# Altium schematic symbol library jlcpcb_2025_04_capacitors_extended_0805.schlib: 3281 symbols (part 8 of 18) (continued)
## CC0805JRNPO9BN121
designator C?  Capacitance: 120pF  (hidden comment: *)
Capacitor, Ceramic (MLCC), 120pF, ±5%, 50V, NP0, ±5%, SMD 0805; Manufacturer: YAGEO; Manufacturer Part Number: CC0805JRNPO9BN121; Package Size: 0805; JLCPCB Basic Part: No; JLCPCB Part Number: C107109; Supplier 1: LCSC; Category: Capacitors - MLCC; Supplier Part Number 1: C107109; Tolerance: ±5%; Voltage Rating: 50V; Temperature Coefficient: NP0; RoHS: Yes; ComponentLink1Description: Datasheet; ComponentLink1URL: https://wmsc.lcsc.com/wmsc/upload/file/pdf/v2/lcsc/2304140030_YAGEO-CC0805JRNPO9BN121_C107109.pdf; ComponentLink2Description: JLCPCB Part URL; ComponentLink2URL: https://jlcpcb.com/partdetail/C107109; ComponentLink3Description: LCSC Part URL; ComponentLink3URL: https://lcsc.com/product-detail/Multilayer-Ceramic-Capacitors-MLCC---SMD-SMT_YAGEO-YAGEO-CC0805JRNPO9BN121_C107109.html
footprint CAP-0805 (0805 (2012M) Capacitor)
pins: 1, 2

## CC0805JRNPO9BN122
designator C?  Capacitance: 1.2nF  (hidden comment: *)
Capacitor, Ceramic (MLCC), 1.2nF, ±5%, 50V, NP0, ±5%, SMD 0805; Manufacturer: YAGEO; Manufacturer Part Number: CC0805JRNPO9BN122; Package Size: 0805; JLCPCB Basic Part: No; JLCPCB Part Number: C113824; Supplier 1: LCSC; Category: Capacitors - MLCC; Supplier Part Number 1: C113824; Tolerance: ±5%; Voltage Rating: 50V; Temperature Coefficient: NP0; RoHS: Yes; ComponentLink1Description: Datasheet; ComponentLink1URL: https://wmsc.lcsc.com/wmsc/upload/file/pdf/v2/lcsc/2304140030_YAGEO-CC0805JRNPO9BN122_C113824.pdf; ComponentLink2Description: JLCPCB Part URL; ComponentLink2URL: https://jlcpcb.com/partdetail/C113824; ComponentLink3Description: LCSC Part URL; ComponentLink3URL: https://lcsc.com/product-detail/Multilayer-Ceramic-Capacitors-MLCC---SMD-SMT_YAGEO-YAGEO-CC0805JRNPO9BN122_C113824.html
footprint CAP-0805 (0805 (2012M) Capacitor)
pins: 1, 2

## CC0805JRNPO9BN130
designator C?  Capacitance: 13pF  (hidden comment: *)
Capacitor, Ceramic (MLCC), 13pF, ±5%, 50V, NP0, ±5%, SMD 0805; Manufacturer: YAGEO; Manufacturer Part Number: CC0805JRNPO9BN130; Package Size: 0805; JLCPCB Basic Part: No; JLCPCB Part Number: C519918; Supplier 1: LCSC; Category: Capacitors - MLCC; Supplier Part Number 1: C519918; Tolerance: ±5%; Voltage Rating: 50V; Temperature Coefficient: NP0; RoHS: Yes; ComponentLink1Description: Datasheet; ComponentLink1URL: https://wmsc.lcsc.com/wmsc/upload/file/pdf/v2/lcsc/2008031233_YAGEO-CC0805JRNPO9BN130_C519918.pdf; ComponentLink2Description: JLCPCB Part URL; ComponentLink2URL: https://jlcpcb.com/partdetail/C519918; ComponentLink3Description: LCSC Part URL; ComponentLink3URL: https://lcsc.com/product-detail/Multilayer-Ceramic-Capacitors-MLCC---SMD-SMT_YAGEO-YAGEO-CC0805JRNPO9BN130_C519918.html
footprint CAP-0805 (0805 (2012M) Capacitor)
pins: 1, 2

## CC0805JRNPO9BN131
designator C?  Capacitance: 130pF  (hidden comment: *)
Capacitor, Ceramic (MLCC), 130pF, ±5%, 50V, NP0, ±5%, SMD 0805; Manufacturer: YAGEO; Manufacturer Part Number: CC0805JRNPO9BN131; Package Size: 0805; JLCPCB Basic Part: No; JLCPCB Part Number: C520003; Supplier 1: LCSC; Category: Capacitors - MLCC; Supplier Part Number 1: C520003; Tolerance: ±5%; Voltage Rating: 50V; Temperature Coefficient: NP0; RoHS: Yes; ComponentLink1Description: Datasheet; ComponentLink1URL: https://wmsc.lcsc.com/wmsc/upload/file/pdf/v2/lcsc/2006011836_YAGEO-CC0805JRNPO9BN131_C520003.pdf; ComponentLink2Description: JLCPCB Part URL; ComponentLink2URL: https://jlcpcb.com/partdetail/C520003; ComponentLink3Description: LCSC Part URL; ComponentLink3URL: https://lcsc.com/product-detail/Multilayer-Ceramic-Capacitors-MLCC---SMD-SMT_YAGEO-YAGEO-CC0805JRNPO9BN131_C520003.html
footprint CAP-0805 (0805 (2012M) Capacitor)
pins: 1, 2

## CC0805JRNPO9BN140
designator C?  Capacitance: 14pF  (hidden comment: *)
Capacitor, Ceramic (MLCC), 14pF, ±5%, 50V, NP0, ±5%, SMD 0805; Manufacturer: YAGEO; Manufacturer Part Number: CC0805JRNPO9BN140; Package Size: 0805; JLCPCB Basic Part: No; JLCPCB Part Number: C519919; Supplier 1: LCSC; Category: Capacitors - MLCC; Supplier Part Number 1: C519919; Tolerance: ±5%; Voltage Rating: 50V; Temperature Coefficient: NP0; RoHS: Yes; ComponentLink1Description: Datasheet; ComponentLink1URL: https://wmsc.lcsc.com/wmsc/upload/file/pdf/v2/lcsc/2010251434_YAGEO-CC0805JRNPO9BN140_C519919.pdf; ComponentLink2Description: JLCPCB Part URL; ComponentLink2URL: https://jlcpcb.com/partdetail/C519919; ComponentLink3Description: LCSC Part URL; ComponentLink3URL: https://lcsc.com/product-detail/Multilayer-Ceramic-Capacitors-MLCC---SMD-SMT_YAGEO-YAGEO-CC0805JRNPO9BN140_C519919.html
footprint CAP-0805 (0805 (2012M) Capacitor)
pins: 1, 2

## CC0805JRNPO9BN150
designator C?  Capacitance: 15pF  (hidden comment: *)
Capacitor, Ceramic (MLCC), 15pF, ±5%, 50V, NP0, ±5%, SMD 0805; Manufacturer: YAGEO; Manufacturer Part Number: CC0805JRNPO9BN150; Package Size: 0805; JLCPCB Basic Part: No; JLCPCB Part Number: C107110; Supplier 1: LCSC; Category: Capacitors - MLCC; Supplier Part Number 1: C107110; Tolerance: ±5%; Voltage Rating: 50V; Temperature Coefficient: NP0; RoHS: Yes; ComponentLink1Description: Datasheet; ComponentLink1URL: https://wmsc.lcsc.com/wmsc/upload/file/pdf/v2/lcsc/2304140030_YAGEO-CC0805JRNPO9BN150_C107110.pdf; ComponentLink2Description: JLCPCB Part URL; ComponentLink2URL: https://jlcpcb.com/partdetail/C107110; ComponentLink3Description: LCSC Part URL; ComponentLink3URL: https://lcsc.com/product-detail/Multilayer-Ceramic-Capacitors-MLCC---SMD-SMT_YAGEO-YAGEO-CC0805JRNPO9BN150_C107110.html
footprint CAP-0805 (0805 (2012M) Capacitor)
pins: 1, 2

## CC0805JRNPO9BN151
designator C?  Capacitance: 150pF  (hidden comment: *)
Capacitor, Ceramic (MLCC), 150pF, ±5%, 50V, NP0, ±5%, SMD 0805; Manufacturer: YAGEO; Manufacturer Part Number: CC0805JRNPO9BN151; Package Size: 0805; JLCPCB Basic Part: No; JLCPCB Part Number: C107111; Supplier 1: LCSC; Category: Capacitors - MLCC; Supplier Part Number 1: C107111; Tolerance: ±5%; Voltage Rating: 50V; Temperature Coefficient: NP0; RoHS: Yes; ComponentLink1Description: Datasheet; ComponentLink1URL: https://wmsc.lcsc.com/wmsc/upload/file/pdf/v2/lcsc/2304140030_YAGEO-CC0805JRNPO9BN151_C107111.pdf; ComponentLink2Description: JLCPCB Part URL; ComponentLink2URL: https://jlcpcb.com/partdetail/C107111; ComponentLink3Description: LCSC Part URL; ComponentLink3URL: https://lcsc.com/product-detail/Multilayer-Ceramic-Capacitors-MLCC---SMD-SMT_YAGEO-YAGEO-CC0805JRNPO9BN151_C107111.html
footprint CAP-0805 (0805 (2012M) Capacitor)
pins: 1, 2

## CC0805JRNPO9BN152
designator C?  Capacitance: 1.5nF  (hidden comment: *)
Capacitor, Ceramic (MLCC), 1.5nF, ±5%, 50V, NP0, ±5%, SMD 0805; Manufacturer: YAGEO; Manufacturer Part Number: CC0805JRNPO9BN152; Package Size: 0805; JLCPCB Basic Part: No; JLCPCB Part Number: C123260; Supplier 1: LCSC; Category: Capacitors - MLCC; Supplier Part Number 1: C123260; Tolerance: ±5%; Voltage Rating: 50V; Temperature Coefficient: NP0; RoHS: Yes; ComponentLink1Description: Datasheet; ComponentLink1URL: https://wmsc.lcsc.com/wmsc/upload/file/pdf/v2/lcsc/2311211121_YAGEO-CC0805JRNPO9BN152_C123260.pdf; ComponentLink2Description: JLCPCB Part URL; ComponentLink2URL: https://jlcpcb.com/partdetail/C123260; ComponentLink3Description: LCSC Part URL; ComponentLink3URL: https://lcsc.com/product-detail/Multilayer-Ceramic-Capacitors-MLCC---SMD-SMT_YAGEO-YAGEO-CC0805JRNPO9BN152_C123260.html
footprint CAP-0805 (0805 (2012M) Capacitor)
pins: 1, 2

## CC0805JRNPO9BN160
designator C?  Capacitance: 16pF  (hidden comment: *)
Capacitor, Ceramic (MLCC), 16pF, ±5%, 50V, NP0, ±5%, SMD 0805; Manufacturer: YAGEO; Manufacturer Part Number: CC0805JRNPO9BN160; Package Size: 0805; JLCPCB Basic Part: No; JLCPCB Part Number: C519920; Supplier 1: LCSC; Category: Capacitors - MLCC; Supplier Part Number 1: C519920; Tolerance: ±5%; Voltage Rating: 50V; Temperature Coefficient: NP0; RoHS: Yes; ComponentLink1Description: Datasheet; ComponentLink1URL: https://wmsc.lcsc.com/wmsc/upload/file/pdf/v2/lcsc/2008031233_YAGEO-CC0805JRNPO9BN160_C519920.pdf; ComponentLink2Description: JLCPCB Part URL; ComponentLink2URL: https://jlcpcb.com/partdetail/C519920; ComponentLink3Description: LCSC Part URL; ComponentLink3URL: https://lcsc.com/product-detail/Multilayer-Ceramic-Capacitors-MLCC---SMD-SMT_YAGEO-YAGEO-CC0805JRNPO9BN160_C519920.html
footprint CAP-0805 (0805 (2012M) Capacitor)
pins: 1, 2

## CC0805JRNPO9BN161
designator C?  Capacitance: 160pF  (hidden comment: *)
Capacitor, Ceramic (MLCC), 160pF, ±5%, 50V, NP0, ±5%, SMD 0805; Manufacturer: YAGEO; Manufacturer Part Number: CC0805JRNPO9BN161; Package Size: 0805; JLCPCB Basic Part: No; JLCPCB Part Number: C1853295; Supplier 1: LCSC; Category: Capacitors - MLCC; Supplier Part Number 1: C1853295; Tolerance: ±5%; Voltage Rating: 50V; Temperature Coefficient: NP0; RoHS: Yes; ComponentLink1Description: Datasheet; ComponentLink1URL: https://wmsc.lcsc.com/wmsc/upload/file/pdf/v2/lcsc/2201271030_YAGEO-CC0805JRNPO9BN161_C1853295.pdf; ComponentLink2Description: JLCPCB Part URL; ComponentLink2URL: https://jlcpcb.com/partdetail/C1853295; ComponentLink3Description: LCSC Part URL; ComponentLink3URL: https://lcsc.com/product-detail/Multilayer-Ceramic-Capacitors-MLCC---SMD-SMT_YAGEO-YAGEO-CC0805JRNPO9BN161_C1853295.html
footprint CAP-0805 (0805 (2012M) Capacitor)
pins: 1, 2

## CC0805JRNPO9BN180
designator C?  Capacitance: 18pF  (hidden comment: *)
Capacitor, Ceramic (MLCC), 18pF, ±5%, 50V, NP0, ±5%, SMD 0805; Manufacturer: YAGEO; Manufacturer Part Number: CC0805JRNPO9BN180; Package Size: 0805; JLCPCB Basic Part: No; JLCPCB Part Number: C113825; Supplier 1: LCSC; Category: Capacitors - MLCC; Supplier Part Number 1: C113825; Tolerance: ±5%; Voltage Rating: 50V; Temperature Coefficient: NP0; RoHS: Yes; ComponentLink1Description: Datasheet; ComponentLink1URL: https://wmsc.lcsc.com/wmsc/upload/file/pdf/v2/lcsc/2304140030_YAGEO-CC0805JRNPO9BN180_C113825.pdf; ComponentLink2Description: JLCPCB Part URL; ComponentLink2URL: https://jlcpcb.com/partdetail/C113825; ComponentLink3Description: LCSC Part URL; ComponentLink3URL: https://lcsc.com/product-detail/Multilayer-Ceramic-Capacitors-MLCC---SMD-SMT_YAGEO-YAGEO-CC0805JRNPO9BN180_C113825.html
footprint CAP-0805 (0805 (2012M) Capacitor)
pins: 1, 2

## CC0805JRNPO9BN181
designator C?  Capacitance: 180pF  (hidden comment: *)
Capacitor, Ceramic (MLCC), 180pF, ±5%, 50V, NP0, ±5%, SMD 0805; Manufacturer: YAGEO; Manufacturer Part Number: CC0805JRNPO9BN181; Package Size: 0805; JLCPCB Basic Part: No; JLCPCB Part Number: C113826; Supplier 1: LCSC; Category: Capacitors - MLCC; Supplier Part Number 1: C113826; Tolerance: ±5%; Voltage Rating: 50V; Temperature Coefficient: NP0; RoHS: Yes; ComponentLink1Description: Datasheet; ComponentLink1URL: https://wmsc.lcsc.com/wmsc/upload/file/pdf/v2/lcsc/2304140030_YAGEO-CC0805JRNPO9BN181_C113826.pdf; ComponentLink2Description: JLCPCB Part URL; ComponentLink2URL: https://jlcpcb.com/partdetail/C113826; ComponentLink3Description: LCSC Part URL; ComponentLink3URL: https://lcsc.com/product-detail/Multilayer-Ceramic-Capacitors-MLCC---SMD-SMT_YAGEO-YAGEO-CC0805JRNPO9BN181_C113826.html
footprint CAP-0805 (0805 (2012M) Capacitor)
pins: 1, 2

## CC0805JRNPO9BN182
designator C?  Capacitance: 1.8nF  (hidden comment: *)
Capacitor, Ceramic (MLCC), 1.8nF, ±5%, 50V, NP0, ±5%, SMD 0805; Manufacturer: YAGEO; Manufacturer Part Number: CC0805JRNPO9BN182; Package Size: 0805; JLCPCB Basic Part: No; JLCPCB Part Number: C541499; Supplier 1: LCSC; Category: Capacitors - MLCC; Supplier Part Number 1: C541499; Tolerance: ±5%; Voltage Rating: 50V; Temperature Coefficient: NP0; RoHS: Yes; ComponentLink1Description: Datasheet; ComponentLink1URL: https://wmsc.lcsc.com/wmsc/upload/file/pdf/v2/lcsc/2006151141_YAGEO-CC0805JRNPO9BN182_C541499.pdf; ComponentLink2Description: JLCPCB Part URL; ComponentLink2URL: https://jlcpcb.com/partdetail/C541499; ComponentLink3Description: LCSC Part URL; ComponentLink3URL: https://lcsc.com/product-detail/Multilayer-Ceramic-Capacitors-MLCC---SMD-SMT_YAGEO-YAGEO-CC0805JRNPO9BN182_C541499.html
footprint CAP-0805 (0805 (2012M) Capacitor)
pins: 1, 2

## CC0805JRNPO9BN200
designator C?  Capacitance: 20pF  (hidden comment: *)
Capacitor, Ceramic (MLCC), 20pF, ±5%, 50V, NP0, ±5%, SMD 0805; Manufacturer: YAGEO; Manufacturer Part Number: CC0805JRNPO9BN200; Package Size: 0805; JLCPCB Basic Part: No; JLCPCB Part Number: C105173; Supplier 1: LCSC; Category: Capacitors - MLCC; Supplier Part Number 1: C105173; Tolerance: ±5%; Voltage Rating: 50V; Temperature Coefficient: NP0; RoHS: Yes; ComponentLink1Description: Datasheet; ComponentLink1URL: https://wmsc.lcsc.com/wmsc/upload/file/pdf/v2/lcsc/2304140030_YAGEO-CC0805JRNPO9BN200_C105173.pdf; ComponentLink2Description: JLCPCB Part URL; ComponentLink2URL: https://jlcpcb.com/partdetail/C105173; ComponentLink3Description: LCSC Part URL; ComponentLink3URL: https://lcsc.com/product-detail/Multilayer-Ceramic-Capacitors-MLCC---SMD-SMT_YAGEO-YAGEO-CC0805JRNPO9BN200_C105173.html
footprint CAP-0805 (0805 (2012M) Capacitor)
pins: 1, 2

## CC0805JRNPO9BN201
designator C?  Capacitance: 200pF  (hidden comment: *)
Capacitor, Ceramic (MLCC), 200pF, ±5%, 50V, NP0, ±5%, SMD 0805; Manufacturer: YAGEO; Manufacturer Part Number: CC0805JRNPO9BN201; Package Size: 0805; JLCPCB Basic Part: No; JLCPCB Part Number: C520004; Supplier 1: LCSC; Category: Capacitors - MLCC; Supplier Part Number 1: C520004; Tolerance: ±5%; Voltage Rating: 50V; Temperature Coefficient: NP0; RoHS: Yes; ComponentLink1Description: Datasheet; ComponentLink1URL: https://wmsc.lcsc.com/wmsc/upload/file/pdf/v2/lcsc/2007231534_YAGEO-CC0805JRNPO9BN201_C520004.pdf; ComponentLink2Description: JLCPCB Part URL; ComponentLink2URL: https://jlcpcb.com/partdetail/C520004; ComponentLink3Description: LCSC Part URL; ComponentLink3URL: https://lcsc.com/product-detail/Multilayer-Ceramic-Capacitors-MLCC---SMD-SMT_YAGEO-YAGEO-CC0805JRNPO9BN201_C520004.html
footprint CAP-0805 (0805 (2012M) Capacitor)
pins: 1, 2

## CC0805JRNPO9BN220
designator C?  Capacitance: 22pF  (hidden comment: *)
Capacitor, Ceramic (MLCC), 22pF, ±5%, 50V, NP0, ±5%, SMD 0805; Manufacturer: YAGEO; Manufacturer Part Number: CC0805JRNPO9BN220; Package Size: 0805; JLCPCB Basic Part: No; JLCPCB Part Number: C105623; Supplier 1: LCSC; Category: Capacitors - MLCC; Supplier Part Number 1: C105623; Tolerance: ±5%; Voltage Rating: 50V; Temperature Coefficient: NP0; RoHS: Yes; ComponentLink1Description: Datasheet; ComponentLink1URL: https://wmsc.lcsc.com/wmsc/upload/file/pdf/v2/lcsc/2304140030_YAGEO-CC0805JRNPO9BN220_C105623.pdf; ComponentLink2Description: JLCPCB Part URL; ComponentLink2URL: https://jlcpcb.com/partdetail/C105623; ComponentLink3Description: LCSC Part URL; ComponentLink3URL: https://lcsc.com/product-detail/Multilayer-Ceramic-Capacitors-MLCC---SMD-SMT_YAGEO-YAGEO-CC0805JRNPO9BN220_C105623.html
footprint CAP-0805 (0805 (2012M) Capacitor)
pins: 1, 2

## CC0805JRNPO9BN221
designator C?  Capacitance: 220pF  (hidden comment: *)
Capacitor, Ceramic (MLCC), 220pF, ±5%, 50V, NP0, ±5%, SMD 0805; Manufacturer: YAGEO; Manufacturer Part Number: CC0805JRNPO9BN221; Package Size: 0805; JLCPCB Basic Part: No; JLCPCB Part Number: C107112; Supplier 1: LCSC; Category: Capacitors - MLCC; Supplier Part Number 1: C107112; Tolerance: ±5%; Voltage Rating: 50V; Temperature Coefficient: NP0; RoHS: Yes; ComponentLink1Description: Datasheet; ComponentLink1URL: https://wmsc.lcsc.com/wmsc/upload/file/pdf/v2/lcsc/2304140030_YAGEO-CC0805JRNPO9BN221_C107112.pdf; ComponentLink2Description: JLCPCB Part URL; ComponentLink2URL: https://jlcpcb.com/partdetail/C107112; ComponentLink3Description: LCSC Part URL; ComponentLink3URL: https://lcsc.com/product-detail/Multilayer-Ceramic-Capacitors-MLCC---SMD-SMT_YAGEO-YAGEO-CC0805JRNPO9BN221_C107112.html
footprint CAP-0805 (0805 (2012M) Capacitor)
pins: 1, 2

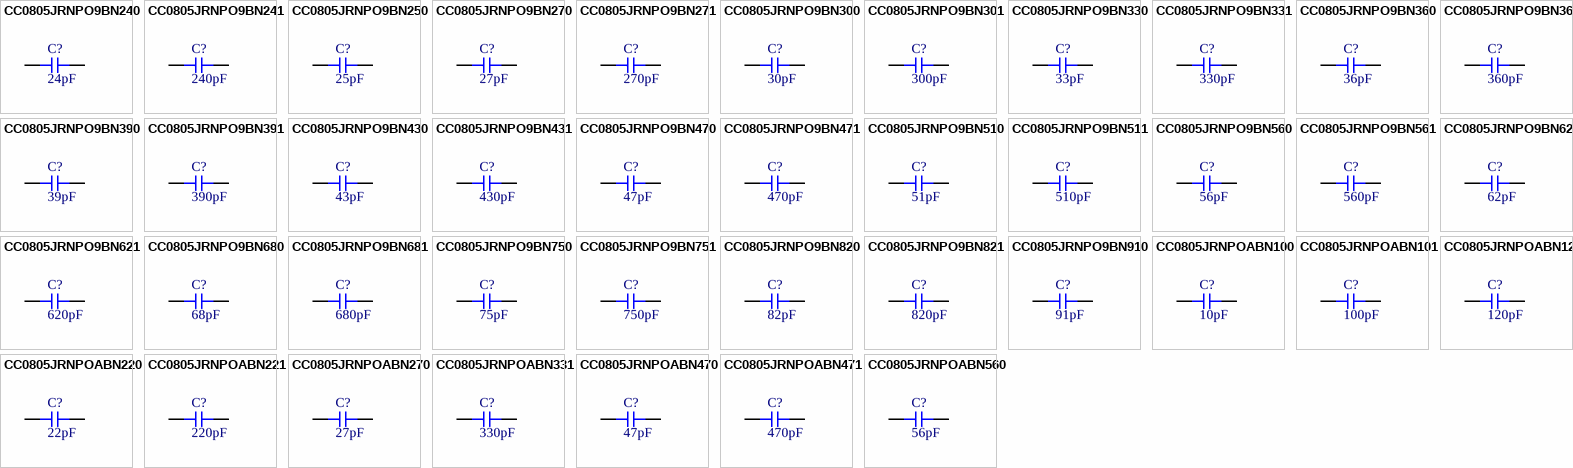
[diagram p36: symbols CC0805JRNPO9BN240 to CC0805JRNPOABN560]

## CC0805JRNPO9BN240
designator C?  Capacitance: 24pF  (hidden comment: *)
Capacitor, Ceramic (MLCC), 24pF, ±5%, 50V, NP0, ±5%, SMD 0805; Manufacturer: YAGEO; Manufacturer Part Number: CC0805JRNPO9BN240; Package Size: 0805; JLCPCB Basic Part: No; JLCPCB Part Number: C113827; Supplier 1: LCSC; Category: Capacitors - MLCC; Supplier Part Number 1: C113827; Tolerance: ±5%; Voltage Rating: 50V; Temperature Coefficient: NP0; RoHS: Yes; ComponentLink1Description: Datasheet; ComponentLink1URL: https://wmsc.lcsc.com/wmsc/upload/file/pdf/v2/lcsc/2304140030_YAGEO-CC0805JRNPO9BN240_C113827.pdf; ComponentLink2Description: JLCPCB Part URL; ComponentLink2URL: https://jlcpcb.com/partdetail/C113827; ComponentLink3Description: LCSC Part URL; ComponentLink3URL: https://lcsc.com/product-detail/Multilayer-Ceramic-Capacitors-MLCC---SMD-SMT_YAGEO-YAGEO-CC0805JRNPO9BN240_C113827.html
footprint CAP-0805 (0805 (2012M) Capacitor)
pins: 1, 2

## CC0805JRNPO9BN241
designator C?  Capacitance: 240pF  (hidden comment: *)
Capacitor, Ceramic (MLCC), 240pF, ±5%, 50V, NP0, ±5%, SMD 0805; Manufacturer: YAGEO; Manufacturer Part Number: CC0805JRNPO9BN241; Package Size: 0805; JLCPCB Basic Part: No; JLCPCB Part Number: C520005; Supplier 1: LCSC; Category: Capacitors - MLCC; Supplier Part Number 1: C520005; Tolerance: ±5%; Voltage Rating: 50V; Temperature Coefficient: NP0; RoHS: Yes; ComponentLink1Description: Datasheet; ComponentLink1URL: https://wmsc.lcsc.com/wmsc/upload/file/pdf/v2/lcsc/2007231534_YAGEO-CC0805JRNPO9BN241_C520005.pdf; ComponentLink2Description: JLCPCB Part URL; ComponentLink2URL: https://jlcpcb.com/partdetail/C520005; ComponentLink3Description: LCSC Part URL; ComponentLink3URL: https://lcsc.com/product-detail/Multilayer-Ceramic-Capacitors-MLCC---SMD-SMT_YAGEO-YAGEO-CC0805JRNPO9BN241_C520005.html
footprint CAP-0805 (0805 (2012M) Capacitor)
pins: 1, 2

## CC0805JRNPO9BN250
designator C?  Capacitance: 25pF  (hidden comment: *)
Capacitor, Ceramic (MLCC), 25pF, ±5%, 50V, NP0, ±5%, SMD 0805; Manufacturer: YAGEO; Manufacturer Part Number: CC0805JRNPO9BN250; Package Size: 0805; JLCPCB Basic Part: No; JLCPCB Part Number: C327030; Supplier 1: LCSC; Category: Capacitors - MLCC; Supplier Part Number 1: C327030; Tolerance: ±5%; Voltage Rating: 50V; Temperature Coefficient: NP0; RoHS: Yes; ComponentLink1Description: Datasheet; ComponentLink1URL: https://wmsc.lcsc.com/wmsc/upload/file/pdf/v2/lcsc/1811141227_YAGEO-CC0805JRNPO9BN250_C327030.pdf; ComponentLink2Description: JLCPCB Part URL; ComponentLink2URL: https://jlcpcb.com/partdetail/C327030; ComponentLink3Description: LCSC Part URL; ComponentLink3URL: https://lcsc.com/product-detail/Multilayer-Ceramic-Capacitors-MLCC---SMD-SMT_YAGEO-YAGEO-CC0805JRNPO9BN250_C327030.html
footprint CAP-0805 (0805 (2012M) Capacitor)
pins: 1, 2

## CC0805JRNPO9BN270
designator C?  Capacitance: 27pF  (hidden comment: *)
Capacitor, Ceramic (MLCC), 27pF, ±5%, 50V, NP0, ±5%, SMD 0805; Manufacturer: YAGEO; Manufacturer Part Number: CC0805JRNPO9BN270; Package Size: 0805; JLCPCB Basic Part: No; JLCPCB Part Number: C107113; Supplier 1: LCSC; Category: Capacitors - MLCC; Supplier Part Number 1: C107113; Tolerance: ±5%; Voltage Rating: 50V; Temperature Coefficient: NP0; RoHS: Yes; ComponentLink1Description: Datasheet; ComponentLink1URL: https://wmsc.lcsc.com/wmsc/upload/file/pdf/v2/lcsc/2304140030_YAGEO-CC0805JRNPO9BN270_C107113.pdf; ComponentLink2Description: JLCPCB Part URL; ComponentLink2URL: https://jlcpcb.com/partdetail/C107113; ComponentLink3Description: LCSC Part URL; ComponentLink3URL: https://lcsc.com/product-detail/Multilayer-Ceramic-Capacitors-MLCC---SMD-SMT_YAGEO-YAGEO-CC0805JRNPO9BN270_C107113.html
footprint CAP-0805 (0805 (2012M) Capacitor)
pins: 1, 2

## CC0805JRNPO9BN271
designator C?  Capacitance: 270pF  (hidden comment: *)
Capacitor, Ceramic (MLCC), 270pF, ±5%, 50V, NP0, ±5%, SMD 0805; Manufacturer: YAGEO; Manufacturer Part Number: CC0805JRNPO9BN271; Package Size: 0805; JLCPCB Basic Part: No; JLCPCB Part Number: C113828; Supplier 1: LCSC; Category: Capacitors - MLCC; Supplier Part Number 1: C113828; Tolerance: ±5%; Voltage Rating: 50V; Temperature Coefficient: NP0; RoHS: Yes; ComponentLink1Description: Datasheet; ComponentLink1URL: https://wmsc.lcsc.com/wmsc/upload/file/pdf/v2/lcsc/2304140030_YAGEO-CC0805JRNPO9BN271_C113828.pdf; ComponentLink2Description: JLCPCB Part URL; ComponentLink2URL: https://jlcpcb.com/partdetail/C113828; ComponentLink3Description: LCSC Part URL; ComponentLink3URL: https://lcsc.com/product-detail/Multilayer-Ceramic-Capacitors-MLCC---SMD-SMT_YAGEO-YAGEO-CC0805JRNPO9BN271_C113828.html
footprint CAP-0805 (0805 (2012M) Capacitor)
pins: 1, 2

## CC0805JRNPO9BN300
designator C?  Capacitance: 30pF  (hidden comment: *)
Capacitor, Ceramic (MLCC), 30pF, ±5%, 50V, NP0, ±5%, SMD 0805; Manufacturer: YAGEO; Manufacturer Part Number: CC0805JRNPO9BN300; Package Size: 0805; JLCPCB Basic Part: No; JLCPCB Part Number: C107114; Supplier 1: LCSC; Category: Capacitors - MLCC; Supplier Part Number 1: C107114; Tolerance: ±5%; Voltage Rating: 50V; Temperature Coefficient: NP0; RoHS: Yes; ComponentLink1Description: Datasheet; ComponentLink1URL: https://wmsc.lcsc.com/wmsc/upload/file/pdf/v2/lcsc/2304140030_YAGEO-CC0805JRNPO9BN300_C107114.pdf; ComponentLink2Description: JLCPCB Part URL; ComponentLink2URL: https://jlcpcb.com/partdetail/C107114; ComponentLink3Description: LCSC Part URL; ComponentLink3URL: https://lcsc.com/product-detail/Multilayer-Ceramic-Capacitors-MLCC---SMD-SMT_YAGEO-YAGEO-CC0805JRNPO9BN300_C107114.html
footprint CAP-0805 (0805 (2012M) Capacitor)
pins: 1, 2

## CC0805JRNPO9BN301
designator C?  Capacitance: 300pF  (hidden comment: *)
Capacitor, Ceramic (MLCC), 300pF, ±5%, 50V, NP0, ±5%, SMD 0805; Manufacturer: YAGEO; Manufacturer Part Number: CC0805JRNPO9BN301; Package Size: 0805; JLCPCB Basic Part: No; JLCPCB Part Number: C113829; Supplier 1: LCSC; Category: Capacitors - MLCC; Supplier Part Number 1: C113829; Tolerance: ±5%; Voltage Rating: 50V; Temperature Coefficient: NP0; RoHS: Yes; ComponentLink1Description: Datasheet; ComponentLink1URL: https://wmsc.lcsc.com/wmsc/upload/file/pdf/v2/lcsc/2304140030_YAGEO-CC0805JRNPO9BN301_C113829.pdf; ComponentLink2Description: JLCPCB Part URL; ComponentLink2URL: https://jlcpcb.com/partdetail/C113829; ComponentLink3Description: LCSC Part URL; ComponentLink3URL: https://lcsc.com/product-detail/Multilayer-Ceramic-Capacitors-MLCC---SMD-SMT_YAGEO-YAGEO-CC0805JRNPO9BN301_C113829.html
footprint CAP-0805 (0805 (2012M) Capacitor)
pins: 1, 2

## CC0805JRNPO9BN330
designator C?  Capacitance: 33pF  (hidden comment: *)
Capacitor, Ceramic (MLCC), 33pF, ±5%, 50V, NP0, ±5%, SMD 0805; Manufacturer: YAGEO; Manufacturer Part Number: CC0805JRNPO9BN330; Package Size: 0805; JLCPCB Basic Part: No; JLCPCB Part Number: C107115; Supplier 1: LCSC; Category: Capacitors - MLCC; Supplier Part Number 1: C107115; Tolerance: ±5%; Voltage Rating: 50V; Temperature Coefficient: NP0; RoHS: Yes; ComponentLink1Description: Datasheet; ComponentLink1URL: https://wmsc.lcsc.com/wmsc/upload/file/pdf/v2/lcsc/2304140030_YAGEO-CC0805JRNPO9BN330_C107115.pdf; ComponentLink2Description: JLCPCB Part URL; ComponentLink2URL: https://jlcpcb.com/partdetail/C107115; ComponentLink3Description: LCSC Part URL; ComponentLink3URL: https://lcsc.com/product-detail/Multilayer-Ceramic-Capacitors-MLCC---SMD-SMT_YAGEO-YAGEO-CC0805JRNPO9BN330_C107115.html
footprint CAP-0805 (0805 (2012M) Capacitor)
pins: 1, 2

## CC0805JRNPO9BN331
designator C?  Capacitance: 330pF  (hidden comment: *)
Capacitor, Ceramic (MLCC), 330pF, ±5%, 50V, NP0, ±5%, SMD 0805; Manufacturer: YAGEO; Manufacturer Part Number: CC0805JRNPO9BN331; Package Size: 0805; JLCPCB Basic Part: No; JLCPCB Part Number: C107116; Supplier 1: LCSC; Category: Capacitors - MLCC; Supplier Part Number 1: C107116; Tolerance: ±5%; Voltage Rating: 50V; Temperature Coefficient: NP0; RoHS: Yes; ComponentLink1Description: Datasheet; ComponentLink1URL: https://wmsc.lcsc.com/wmsc/upload/file/pdf/v2/lcsc/2304140030_YAGEO-CC0805JRNPO9BN331_C107116.pdf; ComponentLink2Description: JLCPCB Part URL; ComponentLink2URL: https://jlcpcb.com/partdetail/C107116; ComponentLink3Description: LCSC Part URL; ComponentLink3URL: https://lcsc.com/product-detail/Multilayer-Ceramic-Capacitors-MLCC---SMD-SMT_YAGEO-YAGEO-CC0805JRNPO9BN331_C107116.html
footprint CAP-0805 (0805 (2012M) Capacitor)
pins: 1, 2

## CC0805JRNPO9BN360
designator C?  Capacitance: 36pF  (hidden comment: *)
Capacitor, Ceramic (MLCC), 36pF, ±5%, 50V, NP0, ±5%, SMD 0805; Manufacturer: YAGEO; Manufacturer Part Number: CC0805JRNPO9BN360; Package Size: 0805; JLCPCB Basic Part: No; JLCPCB Part Number: C327231; Supplier 1: LCSC; Category: Capacitors - MLCC; Supplier Part Number 1: C327231; Tolerance: ±5%; Voltage Rating: 50V; Temperature Coefficient: NP0; RoHS: Yes; ComponentLink1Description: Datasheet; ComponentLink1URL: https://wmsc.lcsc.com/wmsc/upload/file/pdf/v2/lcsc/1811141225_YAGEO-CC0805JRNPO9BN360_C327231.pdf; ComponentLink2Description: JLCPCB Part URL; ComponentLink2URL: https://jlcpcb.com/partdetail/C327231; ComponentLink3Description: LCSC Part URL; ComponentLink3URL: https://lcsc.com/product-detail/Multilayer-Ceramic-Capacitors-MLCC---SMD-SMT_YAGEO-YAGEO-CC0805JRNPO9BN360_C327231.html
footprint CAP-0805 (0805 (2012M) Capacitor)
pins: 1, 2

## CC0805JRNPO9BN361
designator C?  Capacitance: 360pF  (hidden comment: *)
Capacitor, Ceramic (MLCC), 360pF, ±5%, 50V, NP0, ±5%, SMD 0805; Manufacturer: YAGEO; Manufacturer Part Number: CC0805JRNPO9BN361; Package Size: 0805; JLCPCB Basic Part: No; JLCPCB Part Number: C327150; Supplier 1: LCSC; Category: Capacitors - MLCC; Supplier Part Number 1: C327150; Tolerance: ±5%; Voltage Rating: 50V; Temperature Coefficient: NP0; RoHS: Yes; ComponentLink1Description: Datasheet; ComponentLink1URL: https://wmsc.lcsc.com/wmsc/upload/file/pdf/v2/lcsc/1811141224_YAGEO-CC0805JRNPO9BN361_C327150.pdf; ComponentLink2Description: JLCPCB Part URL; ComponentLink2URL: https://jlcpcb.com/partdetail/C327150; ComponentLink3Description: LCSC Part URL; ComponentLink3URL: https://lcsc.com/product-detail/Multilayer-Ceramic-Capacitors-MLCC---SMD-SMT_YAGEO-YAGEO-CC0805JRNPO9BN361_C327150.html
footprint CAP-0805 (0805 (2012M) Capacitor)
pins: 1, 2

## CC0805JRNPO9BN390
designator C?  Capacitance: 39pF  (hidden comment: *)
Capacitor, Ceramic (MLCC), 39pF, ±5%, 50V, NP0, ±5%, SMD 0805; Manufacturer: YAGEO; Manufacturer Part Number: CC0805JRNPO9BN390; Package Size: 0805; JLCPCB Basic Part: No; JLCPCB Part Number: C107117; Supplier 1: LCSC; Category: Capacitors - MLCC; Supplier Part Number 1: C107117; Tolerance: ±5%; Voltage Rating: 50V; Temperature Coefficient: NP0; RoHS: Yes; ComponentLink1Description: Datasheet; ComponentLink1URL: https://wmsc.lcsc.com/wmsc/upload/file/pdf/v2/lcsc/2304140030_YAGEO-CC0805JRNPO9BN390_C107117.pdf; ComponentLink2Description: JLCPCB Part URL; ComponentLink2URL: https://jlcpcb.com/partdetail/C107117; ComponentLink3Description: LCSC Part URL; ComponentLink3URL: https://lcsc.com/product-detail/Multilayer-Ceramic-Capacitors-MLCC---SMD-SMT_YAGEO-YAGEO-CC0805JRNPO9BN390_C107117.html
footprint CAP-0805 (0805 (2012M) Capacitor)
pins: 1, 2

## CC0805JRNPO9BN391
designator C?  Capacitance: 390pF  (hidden comment: *)
Capacitor, Ceramic (MLCC), 390pF, ±5%, 50V, NP0, ±5%, SMD 0805; Manufacturer: YAGEO; Manufacturer Part Number: CC0805JRNPO9BN391; Package Size: 0805; JLCPCB Basic Part: No; JLCPCB Part Number: C519975; Supplier 1: LCSC; Category: Capacitors - MLCC; Supplier Part Number 1: C519975; Tolerance: ±5%; Voltage Rating: 50V; Temperature Coefficient: NP0; RoHS: Yes; ComponentLink1Description: Datasheet; ComponentLink1URL: https://wmsc.lcsc.com/wmsc/upload/file/pdf/v2/lcsc/2006011835_YAGEO-CC0805JRNPO9BN391_C519975.pdf; ComponentLink2Description: JLCPCB Part URL; ComponentLink2URL: https://jlcpcb.com/partdetail/C519975; ComponentLink3Description: LCSC Part URL; ComponentLink3URL: https://lcsc.com/product-detail/Multilayer-Ceramic-Capacitors-MLCC---SMD-SMT_YAGEO-YAGEO-CC0805JRNPO9BN391_C519975.html
footprint CAP-0805 (0805 (2012M) Capacitor)
pins: 1, 2

## CC0805JRNPO9BN430
designator C?  Capacitance: 43pF  (hidden comment: *)
Capacitor, Ceramic (MLCC), 43pF, ±5%, 50V, NP0, ±5%, SMD 0805; Manufacturer: YAGEO; Manufacturer Part Number: CC0805JRNPO9BN430; Package Size: 0805; JLCPCB Basic Part: No; JLCPCB Part Number: C519921; Supplier 1: LCSC; Category: Capacitors - MLCC; Supplier Part Number 1: C519921; Tolerance: ±5%; Voltage Rating: 50V; Temperature Coefficient: NP0; RoHS: Yes; ComponentLink1Description: Datasheet; ComponentLink1URL: https://wmsc.lcsc.com/wmsc/upload/file/pdf/v2/lcsc/2009111706_YAGEO-CC0805JRNPO9BN430_C519921.pdf; ComponentLink2Description: JLCPCB Part URL; ComponentLink2URL: https://jlcpcb.com/partdetail/C519921; ComponentLink3Description: LCSC Part URL; ComponentLink3URL: https://lcsc.com/product-detail/Multilayer-Ceramic-Capacitors-MLCC---SMD-SMT_YAGEO-YAGEO-CC0805JRNPO9BN430_C519921.html
footprint CAP-0805 (0805 (2012M) Capacitor)
pins: 1, 2

## CC0805JRNPO9BN431
designator C?  Capacitance: 430pF  (hidden comment: *)
Capacitor, Ceramic (MLCC), 430pF, ±5%, 50V, NP0, ±5%, SMD 0805; Manufacturer: YAGEO; Manufacturer Part Number: CC0805JRNPO9BN431; Package Size: 0805; JLCPCB Basic Part: No; JLCPCB Part Number: C520006; Supplier 1: LCSC; Category: Capacitors - MLCC; Supplier Part Number 1: C520006; Tolerance: ±5%; Voltage Rating: 50V; Temperature Coefficient: NP0; RoHS: Yes; ComponentLink1Description: Datasheet; ComponentLink1URL: https://wmsc.lcsc.com/wmsc/upload/file/pdf/v2/lcsc/2006011836_YAGEO-CC0805JRNPO9BN431_C520006.pdf; ComponentLink2Description: JLCPCB Part URL; ComponentLink2URL: https://jlcpcb.com/partdetail/C520006; ComponentLink3Description: LCSC Part URL; ComponentLink3URL: https://lcsc.com/product-detail/Multilayer-Ceramic-Capacitors-MLCC---SMD-SMT_YAGEO-YAGEO-CC0805JRNPO9BN431_C520006.html
footprint CAP-0805 (0805 (2012M) Capacitor)
pins: 1, 2

## CC0805JRNPO9BN470
designator C?  Capacitance: 47pF  (hidden comment: *)
Capacitor, Ceramic (MLCC), 47pF, ±5%, 50V, NP0, ±5%, SMD 0805; Manufacturer: YAGEO; Manufacturer Part Number: CC0805JRNPO9BN470; Package Size: 0805; JLCPCB Basic Part: No; JLCPCB Part Number: C107118; Supplier 1: LCSC; Category: Capacitors - MLCC; Supplier Part Number 1: C107118; Tolerance: ±5%; Voltage Rating: 50V; Temperature Coefficient: NP0; RoHS: Yes; ComponentLink1Description: Datasheet; ComponentLink1URL: https://wmsc.lcsc.com/wmsc/upload/file/pdf/v2/lcsc/2304140030_YAGEO-CC0805JRNPO9BN470_C107118.pdf; ComponentLink2Description: JLCPCB Part URL; ComponentLink2URL: https://jlcpcb.com/partdetail/C107118; ComponentLink3Description: LCSC Part URL; ComponentLink3URL: https://lcsc.com/product-detail/Multilayer-Ceramic-Capacitors-MLCC---SMD-SMT_YAGEO-YAGEO-CC0805JRNPO9BN470_C107118.html
footprint CAP-0805 (0805 (2012M) Capacitor)
pins: 1, 2

## CC0805JRNPO9BN471
designator C?  Capacitance: 470pF  (hidden comment: *)
Capacitor, Ceramic (MLCC), 470pF, ±5%, 50V, NP0, ±5%, SMD 0805; Manufacturer: YAGEO; Manufacturer Part Number: CC0805JRNPO9BN471; Package Size: 0805; JLCPCB Basic Part: No; JLCPCB Part Number: C62771; Supplier 1: LCSC; Category: Capacitors - MLCC; Supplier Part Number 1: C62771; Tolerance: ±5%; Voltage Rating: 50V; Temperature Coefficient: NP0; RoHS: Yes; ComponentLink1Description: Datasheet; ComponentLink1URL: https://wmsc.lcsc.com/wmsc/upload/file/pdf/v2/lcsc/2304140030_YAGEO-CC0805JRNPO9BN471_C62771.pdf; ComponentLink2Description: JLCPCB Part URL; ComponentLink2URL: https://jlcpcb.com/partdetail/C62771; ComponentLink3Description: LCSC Part URL; ComponentLink3URL: https://lcsc.com/product-detail/Multilayer-Ceramic-Capacitors-MLCC---SMD-SMT_YAGEO-YAGEO-CC0805JRNPO9BN471_C62771.html
footprint CAP-0805 (0805 (2012M) Capacitor)
pins: 1, 2

## CC0805JRNPO9BN510
designator C?  Capacitance: 51pF  (hidden comment: *)
Capacitor, Ceramic (MLCC), 51pF, ±5%, 50V, NP0, ±5%, SMD 0805; Manufacturer: YAGEO; Manufacturer Part Number: CC0805JRNPO9BN510; Package Size: 0805; JLCPCB Basic Part: No; JLCPCB Part Number: C113830; Supplier 1: LCSC; Category: Capacitors - MLCC; Supplier Part Number 1: C113830; Tolerance: ±5%; Voltage Rating: 50V; Temperature Coefficient: NP0; RoHS: Yes; ComponentLink1Description: Datasheet; ComponentLink1URL: https://wmsc.lcsc.com/wmsc/upload/file/pdf/v2/lcsc/2304140030_YAGEO-CC0805JRNPO9BN510_C113830.pdf; ComponentLink2Description: JLCPCB Part URL; ComponentLink2URL: https://jlcpcb.com/partdetail/C113830; ComponentLink3Description: LCSC Part URL; ComponentLink3URL: https://lcsc.com/product-detail/Multilayer-Ceramic-Capacitors-MLCC---SMD-SMT_YAGEO-YAGEO-CC0805JRNPO9BN510_C113830.html
footprint CAP-0805 (0805 (2012M) Capacitor)
pins: 1, 2

## CC0805JRNPO9BN511
designator C?  Capacitance: 510pF  (hidden comment: *)
Capacitor, Ceramic (MLCC), 510pF, ±5%, 50V, NP0, ±5%, SMD 0805; Manufacturer: YAGEO; Manufacturer Part Number: CC0805JRNPO9BN511; Package Size: 0805; JLCPCB Basic Part: No; JLCPCB Part Number: C309486; Supplier 1: LCSC; Category: Capacitors - MLCC; Supplier Part Number 1: C309486; Tolerance: ±5%; Voltage Rating: 50V; Temperature Coefficient: NP0; RoHS: Yes; ComponentLink1Description: Datasheet; ComponentLink1URL: https://wmsc.lcsc.com/wmsc/upload/file/pdf/v2/lcsc/2304140030_YAGEO-CC0805JRNPO9BN511_C309486.pdf; ComponentLink2Description: JLCPCB Part URL; ComponentLink2URL: https://jlcpcb.com/partdetail/C309486; ComponentLink3Description: LCSC Part URL; ComponentLink3URL: https://lcsc.com/product-detail/Multilayer-Ceramic-Capacitors-MLCC---SMD-SMT_YAGEO-YAGEO-CC0805JRNPO9BN511_C309486.html
footprint CAP-0805 (0805 (2012M) Capacitor)
pins: 1, 2

## CC0805JRNPO9BN560
designator C?  Capacitance: 56pF  (hidden comment: *)
Capacitor, Ceramic (MLCC), 56pF, ±5%, 50V, NP0, ±5%, SMD 0805; Manufacturer: YAGEO; Manufacturer Part Number: CC0805JRNPO9BN560; Package Size: 0805; JLCPCB Basic Part: No; JLCPCB Part Number: C113831; Supplier 1: LCSC; Category: Capacitors - MLCC; Supplier Part Number 1: C113831; Tolerance: ±5%; Voltage Rating: 50V; Temperature Coefficient: NP0; RoHS: Yes; ComponentLink1Description: Datasheet; ComponentLink1URL: https://wmsc.lcsc.com/wmsc/upload/file/pdf/v2/lcsc/2304140030_YAGEO-CC0805JRNPO9BN560_C113831.pdf; ComponentLink2Description: JLCPCB Part URL; ComponentLink2URL: https://jlcpcb.com/partdetail/C113831; ComponentLink3Description: LCSC Part URL; ComponentLink3URL: https://lcsc.com/product-detail/Multilayer-Ceramic-Capacitors-MLCC---SMD-SMT_YAGEO-YAGEO-CC0805JRNPO9BN560_C113831.html
footprint CAP-0805 (0805 (2012M) Capacitor)
pins: 1, 2

## CC0805JRNPO9BN561
designator C?  Capacitance: 560pF  (hidden comment: *)
Capacitor, Ceramic (MLCC), 560pF, ±5%, 50V, NP0, ±5%, SMD 0805; Manufacturer: YAGEO; Manufacturer Part Number: CC0805JRNPO9BN561; Package Size: 0805; JLCPCB Basic Part: No; JLCPCB Part Number: C107119; Supplier 1: LCSC; Category: Capacitors - MLCC; Supplier Part Number 1: C107119; Tolerance: ±5%; Voltage Rating: 50V; Temperature Coefficient: NP0; RoHS: Yes; ComponentLink1Description: Datasheet; ComponentLink1URL: https://wmsc.lcsc.com/wmsc/upload/file/pdf/v2/lcsc/2304140030_YAGEO-CC0805JRNPO9BN561_C107119.pdf; ComponentLink2Description: JLCPCB Part URL; ComponentLink2URL: https://jlcpcb.com/partdetail/C107119; ComponentLink3Description: LCSC Part URL; ComponentLink3URL: https://lcsc.com/product-detail/Multilayer-Ceramic-Capacitors-MLCC---SMD-SMT_YAGEO-YAGEO-CC0805JRNPO9BN561_C107119.html
footprint CAP-0805 (0805 (2012M) Capacitor)
pins: 1, 2

## CC0805JRNPO9BN620
designator C?  Capacitance: 62pF  (hidden comment: *)
Capacitor, Ceramic (MLCC), 62pF, ±5%, 50V, NP0, ±5%, SMD 0805; Manufacturer: YAGEO; Manufacturer Part Number: CC0805JRNPO9BN620; Package Size: 0805; JLCPCB Basic Part: No; JLCPCB Part Number: C519922; Supplier 1: LCSC; Category: Capacitors - MLCC; Supplier Part Number 1: C519922; Tolerance: ±5%; Voltage Rating: 50V; Temperature Coefficient: NP0; RoHS: Yes; ComponentLink1Description: Datasheet; ComponentLink1URL: https://wmsc.lcsc.com/wmsc/upload/file/pdf/v2/lcsc/2005181835_YAGEO-CC0805JRNPO9BN620_C519922.pdf; ComponentLink2Description: JLCPCB Part URL; ComponentLink2URL: https://jlcpcb.com/partdetail/C519922; ComponentLink3Description: LCSC Part URL; ComponentLink3URL: https://lcsc.com/product-detail/Multilayer-Ceramic-Capacitors-MLCC---SMD-SMT_YAGEO-YAGEO-CC0805JRNPO9BN620_C519922.html
footprint CAP-0805 (0805 (2012M) Capacitor)
pins: 1, 2

## CC0805JRNPO9BN621
designator C?  Capacitance: 620pF  (hidden comment: *)
Capacitor, Ceramic (MLCC), 620pF, ±5%, 50V, NP0, ±5%, SMD 0805; Manufacturer: YAGEO; Manufacturer Part Number: CC0805JRNPO9BN621; Package Size: 0805; JLCPCB Basic Part: No; JLCPCB Part Number: C520007; Supplier 1: LCSC; Category: Capacitors - MLCC; Supplier Part Number 1: C520007; Tolerance: ±5%; Voltage Rating: 50V; Temperature Coefficient: NP0; RoHS: Yes; ComponentLink1Description: Datasheet; ComponentLink1URL: https://wmsc.lcsc.com/wmsc/upload/file/pdf/v2/lcsc/2006011836_YAGEO-CC0805JRNPO9BN621_C520007.pdf; ComponentLink2Description: JLCPCB Part URL; ComponentLink2URL: https://jlcpcb.com/partdetail/C520007; ComponentLink3Description: LCSC Part URL; ComponentLink3URL: https://lcsc.com/product-detail/Multilayer-Ceramic-Capacitors-MLCC---SMD-SMT_YAGEO-YAGEO-CC0805JRNPO9BN621_C520007.html
footprint CAP-0805 (0805 (2012M) Capacitor)
pins: 1, 2

## CC0805JRNPO9BN680
designator C?  Capacitance: 68pF  (hidden comment: *)
Capacitor, Ceramic (MLCC), 68pF, ±5%, 50V, NP0, ±5%, SMD 0805; Manufacturer: YAGEO; Manufacturer Part Number: CC0805JRNPO9BN680; Package Size: 0805; JLCPCB Basic Part: No; JLCPCB Part Number: C107120; Supplier 1: LCSC; Category: Capacitors - MLCC; Supplier Part Number 1: C107120; Tolerance: ±5%; Voltage Rating: 50V; Temperature Coefficient: NP0; RoHS: Yes; ComponentLink1Description: Datasheet; ComponentLink1URL: https://wmsc.lcsc.com/wmsc/upload/file/pdf/v2/lcsc/2304140030_YAGEO-CC0805JRNPO9BN680_C107120.pdf; ComponentLink2Description: JLCPCB Part URL; ComponentLink2URL: https://jlcpcb.com/partdetail/C107120; ComponentLink3Description: LCSC Part URL; ComponentLink3URL: https://lcsc.com/product-detail/Multilayer-Ceramic-Capacitors-MLCC---SMD-SMT_YAGEO-YAGEO-CC0805JRNPO9BN680_C107120.html
footprint CAP-0805 (0805 (2012M) Capacitor)
pins: 1, 2

## CC0805JRNPO9BN681
designator C?  Capacitance: 680pF  (hidden comment: *)
Capacitor, Ceramic (MLCC), 680pF, ±5%, 50V, NP0, ±5%, SMD 0805; Manufacturer: YAGEO; Manufacturer Part Number: CC0805JRNPO9BN681; Package Size: 0805; JLCPCB Basic Part: No; JLCPCB Part Number: C107121; Supplier 1: LCSC; Category: Capacitors - MLCC; Supplier Part Number 1: C107121; Tolerance: ±5%; Voltage Rating: 50V; Temperature Coefficient: NP0; RoHS: Yes; ComponentLink1Description: Datasheet; ComponentLink1URL: https://wmsc.lcsc.com/wmsc/upload/file/pdf/v2/lcsc/2304140030_YAGEO-CC0805JRNPO9BN681_C107121.pdf; ComponentLink2Description: JLCPCB Part URL; ComponentLink2URL: https://jlcpcb.com/partdetail/C107121; ComponentLink3Description: LCSC Part URL; ComponentLink3URL: https://lcsc.com/product-detail/Multilayer-Ceramic-Capacitors-MLCC---SMD-SMT_YAGEO-YAGEO-CC0805JRNPO9BN681_C107121.html
footprint CAP-0805 (0805 (2012M) Capacitor)
pins: 1, 2

## CC0805JRNPO9BN750
designator C?  Capacitance: 75pF  (hidden comment: *)
Capacitor, Ceramic (MLCC), 75pF, ±5%, 50V, NP0, ±5%, SMD 0805; Manufacturer: YAGEO; Manufacturer Part Number: CC0805JRNPO9BN750; Package Size: 0805; JLCPCB Basic Part: No; JLCPCB Part Number: C113832; Supplier 1: LCSC; Category: Capacitors - MLCC; Supplier Part Number 1: C113832; Tolerance: ±5%; Voltage Rating: 50V; Temperature Coefficient: NP0; RoHS: Yes; ComponentLink1Description: Datasheet; ComponentLink1URL: https://wmsc.lcsc.com/wmsc/upload/file/pdf/v2/lcsc/2304140030_YAGEO-CC0805JRNPO9BN750_C113832.pdf; ComponentLink2Description: JLCPCB Part URL; ComponentLink2URL: https://jlcpcb.com/partdetail/C113832; ComponentLink3Description: LCSC Part URL; ComponentLink3URL: https://lcsc.com/product-detail/Multilayer-Ceramic-Capacitors-MLCC---SMD-SMT_YAGEO-YAGEO-CC0805JRNPO9BN750_C113832.html
footprint CAP-0805 (0805 (2012M) Capacitor)
pins: 1, 2

## CC0805JRNPO9BN751
designator C?  Capacitance: 750pF  (hidden comment: *)
Capacitor, Ceramic (MLCC), 750pF, ±5%, 50V, NP0, ±5%, SMD 0805; Manufacturer: YAGEO; Manufacturer Part Number: CC0805JRNPO9BN751; Package Size: 0805; JLCPCB Basic Part: No; JLCPCB Part Number: C520008; Supplier 1: LCSC; Category: Capacitors - MLCC; Supplier Part Number 1: C520008; Tolerance: ±5%; Voltage Rating: 50V; Temperature Coefficient: NP0; RoHS: Yes; ComponentLink1Description: Datasheet; ComponentLink1URL: https://wmsc.lcsc.com/wmsc/upload/file/pdf/v2/lcsc/2006011836_YAGEO-CC0805JRNPO9BN751_C520008.pdf; ComponentLink2Description: JLCPCB Part URL; ComponentLink2URL: https://jlcpcb.com/partdetail/C520008; ComponentLink3Description: LCSC Part URL; ComponentLink3URL: https://lcsc.com/product-detail/Multilayer-Ceramic-Capacitors-MLCC---SMD-SMT_YAGEO-YAGEO-CC0805JRNPO9BN751_C520008.html
footprint CAP-0805 (0805 (2012M) Capacitor)
pins: 1, 2

## CC0805JRNPO9BN820
designator C?  Capacitance: 82pF  (hidden comment: *)
Capacitor, Ceramic (MLCC), 82pF, ±5%, 50V, NP0, ±5%, SMD 0805; Manufacturer: YAGEO; Manufacturer Part Number: CC0805JRNPO9BN820; Package Size: 0805; JLCPCB Basic Part: No; JLCPCB Part Number: C113833; Supplier 1: LCSC; Category: Capacitors - MLCC; Supplier Part Number 1: C113833; Tolerance: ±5%; Voltage Rating: 50V; Temperature Coefficient: NP0; RoHS: Yes; ComponentLink1Description: Datasheet; ComponentLink1URL: https://wmsc.lcsc.com/wmsc/upload/file/pdf/v2/lcsc/2304140030_YAGEO-CC0805JRNPO9BN820_C113833.pdf; ComponentLink2Description: JLCPCB Part URL; ComponentLink2URL: https://jlcpcb.com/partdetail/C113833; ComponentLink3Description: LCSC Part URL; ComponentLink3URL: https://lcsc.com/product-detail/Multilayer-Ceramic-Capacitors-MLCC---SMD-SMT_YAGEO-YAGEO-CC0805JRNPO9BN820_C113833.html
footprint CAP-0805 (0805 (2012M) Capacitor)
pins: 1, 2

## CC0805JRNPO9BN821
designator C?  Capacitance: 820pF  (hidden comment: *)
Capacitor, Ceramic (MLCC), 820pF, ±5%, 50V, NP0, ±5%, SMD 0805; Manufacturer: YAGEO; Manufacturer Part Number: CC0805JRNPO9BN821; Package Size: 0805; JLCPCB Basic Part: No; JLCPCB Part Number: C113834; Supplier 1: LCSC; Category: Capacitors - MLCC; Supplier Part Number 1: C113834; Tolerance: ±5%; Voltage Rating: 50V; Temperature Coefficient: NP0; RoHS: Yes; ComponentLink1Description: Datasheet; ComponentLink1URL: https://wmsc.lcsc.com/wmsc/upload/file/pdf/v2/lcsc/2304140030_YAGEO-CC0805JRNPO9BN821_C113834.pdf; ComponentLink2Description: JLCPCB Part URL; ComponentLink2URL: https://jlcpcb.com/partdetail/C113834; ComponentLink3Description: LCSC Part URL; ComponentLink3URL: https://lcsc.com/product-detail/Multilayer-Ceramic-Capacitors-MLCC---SMD-SMT_YAGEO-YAGEO-CC0805JRNPO9BN821_C113834.html
footprint CAP-0805 (0805 (2012M) Capacitor)
pins: 1, 2

## CC0805JRNPO9BN910
designator C?  Capacitance: 91pF  (hidden comment: *)
Capacitor, Ceramic (MLCC), 91pF, ±5%, 50V, NP0, ±5%, SMD 0805; Manufacturer: YAGEO; Manufacturer Part Number: CC0805JRNPO9BN910; Package Size: 0805; JLCPCB Basic Part: No; JLCPCB Part Number: C519923; Supplier 1: LCSC; Category: Capacitors - MLCC; Supplier Part Number 1: C519923; Tolerance: ±5%; Voltage Rating: 50V; Temperature Coefficient: NP0; RoHS: Yes; ComponentLink1Description: Datasheet; ComponentLink1URL: https://wmsc.lcsc.com/wmsc/upload/file/pdf/v2/lcsc/2005181835_YAGEO-CC0805JRNPO9BN910_C519923.pdf; ComponentLink2Description: JLCPCB Part URL; ComponentLink2URL: https://jlcpcb.com/partdetail/C519923; ComponentLink3Description: LCSC Part URL; ComponentLink3URL: https://lcsc.com/product-detail/Multilayer-Ceramic-Capacitors-MLCC---SMD-SMT_YAGEO-YAGEO-CC0805JRNPO9BN910_C519923.html
footprint CAP-0805 (0805 (2012M) Capacitor)
pins: 1, 2

## CC0805JRNPOABN100
designator C?  Capacitance: 10pF  (hidden comment: *)
Capacitor, Ceramic (MLCC), 10pF, ±5%, 200V, NP0, ±5%, SMD 0805; Manufacturer: YAGEO; Manufacturer Part Number: CC0805JRNPOABN100; Package Size: 0805; JLCPCB Basic Part: No; JLCPCB Part Number: C576965; Supplier 1: LCSC; Category: Capacitors - MLCC; Supplier Part Number 1: C576965; Tolerance: ±5%; Voltage Rating: 200V; Temperature Coefficient: NP0; RoHS: Yes; ComponentLink1Description: Datasheet; ComponentLink1URL: https://wmsc.lcsc.com/wmsc/upload/file/pdf/v2/lcsc/2304140030_YAGEO-CC0805JRNPOABN100_C576965.pdf; ComponentLink2Description: JLCPCB Part URL; ComponentLink2URL: https://jlcpcb.com/partdetail/C576965; ComponentLink3Description: LCSC Part URL; ComponentLink3URL: https://lcsc.com/product-detail/Multilayer-Ceramic-Capacitors-MLCC---SMD-SMT_YAGEO-YAGEO-CC0805JRNPOABN100_C576965.html
footprint CAP-0805 (0805 (2012M) Capacitor)
pins: 1, 2

## CC0805JRNPOABN101
designator C?  Capacitance: 100pF  (hidden comment: *)
Capacitor, Ceramic (MLCC), 100pF, ±5%, 200V, NP0, ±5%, SMD 0805; Manufacturer: YAGEO; Manufacturer Part Number: CC0805JRNPOABN101; Package Size: 0805; JLCPCB Basic Part: No; JLCPCB Part Number: C113835; Supplier 1: LCSC; Category: Capacitors - MLCC; Supplier Part Number 1: C113835; Tolerance: ±5%; Voltage Rating: 200V; Temperature Coefficient: NP0; RoHS: Yes; ComponentLink1Description: Datasheet; ComponentLink1URL: https://wmsc.lcsc.com/wmsc/upload/file/pdf/v2/lcsc/2304140030_YAGEO-CC0805JRNPOABN101_C113835.pdf; ComponentLink2Description: JLCPCB Part URL; ComponentLink2URL: https://jlcpcb.com/partdetail/C113835; ComponentLink3Description: LCSC Part URL; ComponentLink3URL: https://lcsc.com/product-detail/Multilayer-Ceramic-Capacitors-MLCC---SMD-SMT_YAGEO-YAGEO-CC0805JRNPOABN101_C113835.html
footprint CAP-0805 (0805 (2012M) Capacitor)
pins: 1, 2

## CC0805JRNPOABN121
designator C?  Capacitance: 120pF  (hidden comment: *)
Capacitor, Ceramic (MLCC), 120pF, ±5%, 200V, NP0, ±5%, SMD 0805; Manufacturer: YAGEO; Manufacturer Part Number: CC0805JRNPOABN121; Package Size: 0805; JLCPCB Basic Part: No; JLCPCB Part Number: C527208; Supplier 1: LCSC; Category: Capacitors - MLCC; Supplier Part Number 1: C527208; Tolerance: ±5%; Voltage Rating: 200V; Temperature Coefficient: NP0; RoHS: Yes; ComponentLink1Description: Datasheet; ComponentLink1URL: https://wmsc.lcsc.com/wmsc/upload/file/pdf/v2/lcsc/2007021836_YAGEO-CC0805JRNPOABN121_C527208.pdf; ComponentLink2Description: JLCPCB Part URL; ComponentLink2URL: https://jlcpcb.com/partdetail/C527208; ComponentLink3Description: LCSC Part URL; ComponentLink3URL: https://lcsc.com/product-detail/Multilayer-Ceramic-Capacitors-MLCC---SMD-SMT_YAGEO-YAGEO-CC0805JRNPOABN121_C527208.html
footprint CAP-0805 (0805 (2012M) Capacitor)
pins: 1, 2